# Altium integrated library Altium_WCAP-ATG8 (rev22a).IntLib: 195 symbols (part 2 of 2) (continued)
## 860010772003
designator C?, comment 0.33uF  (value not drawn)
WCAP-ATG8 Aluminum Electrolytic Capacitor, Radial THT, D5xH11mm, 0.33uF, 63V; Manufacturer: Wurth Elektronik; Manufacturer Part Number: 860010772003; Capacitance Tolerance: +/-20%; Dissipation Factor: 9%; Endurance: 2000h; Leakage Current: 3uA; Ripple Current: 6mA; Technical Reference: ATBC110R33M063DSPA3B000; ComponentLink1Description: Manufacturer Link; ComponentLink1URL: https://www.we-online.com/redexpert/article/860010772003?ad; ComponentLink2Description: Datasheet; ComponentLink2URL: https://www.we-online.com/redexpert/spec/860010772003?ad; Category: Aluminum Electrolytic Capacitors; Match Code: WCAP-ATG8; Mount: Through Hole; Operating Temperature Max: 85°C; Operating Temperature Min: -40°C; Packaging: Ammo Pack; Height: 11mm; Diameter: 5mm; Capacitance: 0.33uF; Rated Voltage (DC): 63V
footprint WCAP-ATG8_D5H11
pins: 1 P, 2 N

## 860010772004
designator C?, comment 0.47uF  (value not drawn)
WCAP-ATG8 Aluminum Electrolytic Capacitor, Radial THT, D5xH11mm, 0.47uF, 63V; Manufacturer: Wurth Elektronik; Manufacturer Part Number: 860010772004; Capacitance Tolerance: +/-20%; Dissipation Factor: 9%; Endurance: 2000h; Leakage Current: 3uA; Ripple Current: 8mA; Technical Reference: ATBC110R47M063DSPA3B000; ComponentLink1Description: Manufacturer Link; ComponentLink1URL: https://www.we-online.com/redexpert/article/860010772004?ad; ComponentLink2Description: Datasheet; ComponentLink2URL: https://www.we-online.com/redexpert/spec/860010772004?ad; Category: Aluminum Electrolytic Capacitors; Match Code: WCAP-ATG8; Mount: Through Hole; Operating Temperature Max: 85°C; Operating Temperature Min: -40°C; Packaging: Ammo Pack; Height: 11mm; Diameter: 5mm; Capacitance: 0.47uF; Rated Voltage (DC): 63V
footprint WCAP-ATG8_D5H11
pins: 1 P, 2 N

## 860010772005
designator C?, comment 1uF  (value not drawn)
WCAP-ATG8 Aluminum Electrolytic Capacitor, Radial THT, D5xH11mm, 1uF, 63V; Manufacturer: Wurth Elektronik; Manufacturer Part Number: 860010772005; Capacitance Tolerance: +/-20%; Dissipation Factor: 9%; Endurance: 2000h; Leakage Current: 3uA; Ripple Current: 17mA; Technical Reference: ATBC110010M063DSPA3B000; ComponentLink1Description: Manufacturer Link; ComponentLink1URL: https://www.we-online.com/redexpert/article/860010772005?ad; ComponentLink2Description: Datasheet; ComponentLink2URL: https://www.we-online.com/redexpert/spec/860010772005?ad; Category: Aluminum Electrolytic Capacitors; Match Code: WCAP-ATG8; Mount: Through Hole; Operating Temperature Max: 85°C; Operating Temperature Min: -40°C; Packaging: Ammo Pack; Height: 11mm; Diameter: 5mm; Capacitance: 1uF; Rated Voltage (DC): 63V
footprint WCAP-ATG8_D5H11
pins: 1 P, 2 N

## 860010772006
designator C?, comment 2.2uF  (value not drawn)
WCAP-ATG8 Aluminum Electrolytic Capacitor, Radial THT, D5xH11mm, 2.2uF, 63V; Manufacturer: Wurth Elektronik; Manufacturer Part Number: 860010772006; Capacitance Tolerance: +/-20%; Dissipation Factor: 9%; Endurance: 2000h; Leakage Current: 3uA; Ripple Current: 31mA; Technical Reference: ATBC1102R2M063DSPA3B000; ComponentLink1Description: Manufacturer Link; ComponentLink1URL: https://www.we-online.com/redexpert/article/860010772006?ad; ComponentLink2Description: Datasheet; ComponentLink2URL: https://www.we-online.com/redexpert/spec/860010772006?ad; Category: Aluminum Electrolytic Capacitors; Match Code: WCAP-ATG8; Mount: Through Hole; Operating Temperature Max: 85°C; Operating Temperature Min: -40°C; Packaging: Ammo Pack; Height: 11mm; Diameter: 5mm; Capacitance: 2.2uF; Rated Voltage (DC): 63V
footprint WCAP-ATG8_D5H11
pins: 1 P, 2 N

## 860010772007
designator C?, comment 3.3uF  (value not drawn)
WCAP-ATG8 Aluminum Electrolytic Capacitor, Radial THT, D5xH11mm, 3.3uF, 63V; Manufacturer: Wurth Elektronik; Manufacturer Part Number: 860010772007; Capacitance Tolerance: +/-20%; Dissipation Factor: 9%; Endurance: 2000h; Leakage Current: 3uA; Ripple Current: 39mA; Technical Reference: ATBC1103R3M063DSPA3B000; ComponentLink1Description: Manufacturer Link; ComponentLink1URL: https://www.we-online.com/redexpert/article/860010772007?ad; ComponentLink2Description: Datasheet; ComponentLink2URL: https://www.we-online.com/redexpert/spec/860010772007?ad; Category: Aluminum Electrolytic Capacitors; Match Code: WCAP-ATG8; Mount: Through Hole; Operating Temperature Max: 85°C; Operating Temperature Min: -40°C; Packaging: Ammo Pack; Height: 11mm; Diameter: 5mm; Capacitance: 3.3uF; Rated Voltage (DC): 63V
footprint WCAP-ATG8_D5H11
pins: 1 P, 2 N

## 860010772008
designator C?, comment 4.7uF  (value not drawn)
WCAP-ATG8 Aluminum Electrolytic Capacitor, Radial THT, D5xH11mm, 4.7uF, 63V; Manufacturer: Wurth Elektronik; Manufacturer Part Number: 860010772008; Capacitance Tolerance: +/-20%; Dissipation Factor: 9%; Endurance: 2000h; Leakage Current: 3uA; Ripple Current: 50mA; Technical Reference: ATBC1104R7M063DSPA3B000; ComponentLink1Description: Manufacturer Link; ComponentLink1URL: https://www.we-online.com/redexpert/article/860010772008?ad; ComponentLink2Description: Datasheet; ComponentLink2URL: https://www.we-online.com/redexpert/spec/860010772008?ad; Category: Aluminum Electrolytic Capacitors; Match Code: WCAP-ATG8; Mount: Through Hole; Operating Temperature Max: 85°C; Operating Temperature Min: -40°C; Packaging: Ammo Pack; Height: 11mm; Diameter: 5mm; Capacitance: 4.7uF; Rated Voltage (DC): 63V
footprint WCAP-ATG8_D5H11
pins: 1 P, 2 N

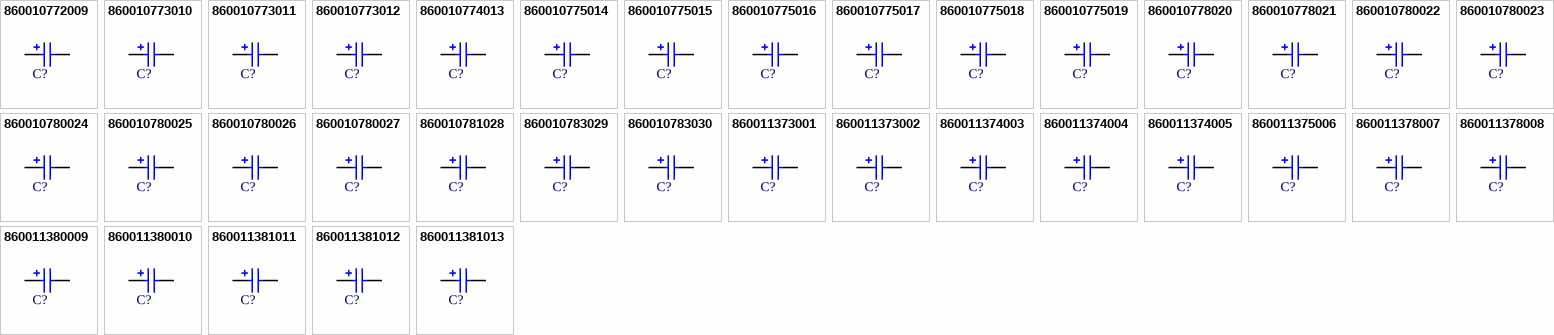
[diagram p4: symbols 860010772009 to 860011381013]

## 860010772009
designator C?, comment 10uF  (value not drawn)
WCAP-ATG8 Aluminum Electrolytic Capacitor, Radial THT, D5xH11mm, 10uF, 63V; Manufacturer: Wurth Elektronik; Manufacturer Part Number: 860010772009; Capacitance Tolerance: +/-20%; Dissipation Factor: 9%; Endurance: 2000h; Leakage Current: 6.3uA; Ripple Current: 77mA; Technical Reference: ATBC110100M063DSPA3B000; ComponentLink1Description: Manufacturer Link; ComponentLink1URL: https://www.we-online.com/redexpert/article/860010772009?ad; ComponentLink2Description: Datasheet; ComponentLink2URL: https://www.we-online.com/redexpert/spec/860010772009?ad; Category: Aluminum Electrolytic Capacitors; Match Code: WCAP-ATG8; Mount: Through Hole; Operating Temperature Max: 85°C; Operating Temperature Min: -40°C; Packaging: Ammo Pack; Height: 11mm; Diameter: 5mm; Capacitance: 10uF; Rated Voltage (DC): 63V
footprint WCAP-ATG8_D5H11
pins: 1 P, 2 N

## 860010773010
designator C?, comment 22uF  (value not drawn)
WCAP-ATG8 Aluminum Electrolytic Capacitor, Radial THT, D6.3xH11mm, 22uF, 63V; Manufacturer: Wurth Elektronik; Manufacturer Part Number: 860010773010; Capacitance Tolerance: +/-20%; Dissipation Factor: 9%; Endurance: 2000h; Leakage Current: 13.86uA; Ripple Current: 127mA; Technical Reference: ATBD110220M063DSPA4B000; ComponentLink1Description: Manufacturer Link; ComponentLink1URL: https://www.we-online.com/redexpert/article/860010773010?ad; ComponentLink2Description: Datasheet; ComponentLink2URL: https://www.we-online.com/redexpert/spec/860010773010?ad; Category: Aluminum Electrolytic Capacitors; Match Code: WCAP-ATG8; Mount: Through Hole; Operating Temperature Max: 85°C; Operating Temperature Min: -40°C; Packaging: Ammo Pack; Height: 11mm; Diameter: 6.3mm; Capacitance: 22uF; Rated Voltage (DC): 63V
footprint WCAP-ATG8_D6.3H11
pins: 1 P, 2 N

## 860010773011
designator C?, comment 33uF  (value not drawn)
WCAP-ATG8 Aluminum Electrolytic Capacitor, Radial THT, D6.3xH11mm, 33uF, 63V; Manufacturer: Wurth Elektronik; Manufacturer Part Number: 860010773011; Capacitance Tolerance: +/-20%; Dissipation Factor: 9%; Endurance: 2000h; Leakage Current: 20.79uA; Ripple Current: 149mA; Technical Reference: ATBD110330M063DSPA4B000; ComponentLink1Description: Manufacturer Link; ComponentLink1URL: https://www.we-online.com/redexpert/article/860010773011?ad; ComponentLink2Description: Datasheet; ComponentLink2URL: https://www.we-online.com/redexpert/spec/860010773011?ad; Category: Aluminum Electrolytic Capacitors; Match Code: WCAP-ATG8; Mount: Through Hole; Operating Temperature Max: 85°C; Operating Temperature Min: -40°C; Packaging: Ammo Pack; Height: 11mm; Diameter: 6.3mm; Capacitance: 33uF; Rated Voltage (DC): 63V
footprint WCAP-ATG8_D6.3H11
pins: 1 P, 2 N

## 860010773012
designator C?, comment 47uF  (value not drawn)
WCAP-ATG8 Aluminum Electrolytic Capacitor, Radial THT, D6.3xH11mm, 47uF, 63V; Manufacturer: Wurth Elektronik; Manufacturer Part Number: 860010773012; Capacitance Tolerance: +/-20%; Dissipation Factor: 9%; Endurance: 2000h; Leakage Current: 29.61uA; Ripple Current: 198mA; Technical Reference: ATBD110470M063DSPA4B000; ComponentLink1Description: Manufacturer Link; ComponentLink1URL: https://www.we-online.com/redexpert/article/860010773012?ad; ComponentLink2Description: Datasheet; ComponentLink2URL: https://www.we-online.com/redexpert/spec/860010773012?ad; Category: Aluminum Electrolytic Capacitors; Match Code: WCAP-ATG8; Mount: Through Hole; Operating Temperature Max: 85°C; Operating Temperature Min: -40°C; Packaging: Ammo Pack; Height: 11mm; Diameter: 6.3mm; Capacitance: 47uF; Rated Voltage (DC): 63V
footprint WCAP-ATG8_D6.3H11
pins: 1 P, 2 N

## 860010774013
designator C?, comment 68uF  (value not drawn)
WCAP-ATG8 Aluminum Electrolytic Capacitor, Radial THT, D8xH11.5mm, 68uF, 63V; Manufacturer: Wurth Elektronik; Manufacturer Part Number: 860010774013; Capacitance Tolerance: +/-20%; Dissipation Factor: 9%; Endurance: 2000h; Leakage Current: 42.84uA; Ripple Current: 253mA; Technical Reference: ATBE115680M063DSPA7B000; ComponentLink1Description: Manufacturer Link; ComponentLink1URL: https://www.we-online.com/redexpert/article/860010774013?ad; ComponentLink2Description: Datasheet; ComponentLink2URL: https://www.we-online.com/redexpert/spec/860010774013?ad; Category: Aluminum Electrolytic Capacitors; Match Code: WCAP-ATG8; Mount: Through Hole; Operating Temperature Max: 85°C; Operating Temperature Min: -40°C; Packaging: Ammo Pack; Height: 11.5mm; Diameter: 8mm; Capacitance: 68uF; Rated Voltage (DC): 63V
footprint WCAP-ATG8_D8H11.5
pins: 1 P, 2 N

## 860010775014
designator C?, comment 100uF  (value not drawn)
WCAP-ATG8 Aluminum Electrolytic Capacitor, Radial THT, D10xH12.5mm, 100uF, 63V; Manufacturer: Wurth Elektronik; Manufacturer Part Number: 860010775014; Capacitance Tolerance: +/-20%; Dissipation Factor: 9%; Endurance: 2000h; Leakage Current: 63uA; Ripple Current: 330mA; Technical Reference: ATBF125101M063DSPA9B000; ComponentLink1Description: Manufacturer Link; ComponentLink1URL: https://www.we-online.com/redexpert/article/860010775014?ad; ComponentLink2Description: Datasheet; ComponentLink2URL: https://www.we-online.com/redexpert/spec/860010775014?ad; Category: Aluminum Electrolytic Capacitors; Match Code: WCAP-ATG8; Mount: Through Hole; Operating Temperature Max: 85°C; Operating Temperature Min: -40°C; Packaging: Ammo Pack; Height: 12.5mm; Diameter: 10mm; Capacitance: 100uF; Rated Voltage (DC): 63V
footprint WCAP-ATG8_D10H12.5
pins: 1 P, 2 N

## 860010775015
designator C?, comment 120uF  (value not drawn)
WCAP-ATG8 Aluminum Electrolytic Capacitor, Radial THT, D10xH16mm, 120uF, 63V; Manufacturer: Wurth Elektronik; Manufacturer Part Number: 860010775015; Capacitance Tolerance: +/-20%; Dissipation Factor: 9%; Endurance: 2000h; Leakage Current: 75.6uA; Ripple Current: 396mA; Technical Reference: ATBF160121M063DSPAAB000; ComponentLink1Description: Manufacturer Link; ComponentLink1URL: https://www.we-online.com/redexpert/article/860010775015?ad; ComponentLink2Description: Datasheet; ComponentLink2URL: https://www.we-online.com/redexpert/spec/860010775015?ad; Category: Aluminum Electrolytic Capacitors; Match Code: WCAP-ATG8; Mount: Through Hole; Operating Temperature Max: 85°C; Operating Temperature Min: -40°C; Packaging: Ammo Pack; Height: 16mm; Diameter: 10mm; Capacitance: 120uF; Rated Voltage (DC): 63V
footprint WCAP-ATG8_D10H16
pins: 1 P, 2 N

## 860010775016
designator C?, comment 150uF  (value not drawn)
WCAP-ATG8 Aluminum Electrolytic Capacitor, Radial THT, D10xH16mm, 150uF, 63V; Manufacturer: Wurth Elektronik; Manufacturer Part Number: 860010775016; Capacitance Tolerance: +/-20%; Dissipation Factor: 9%; Endurance: 2000h; Leakage Current: 94.5uA; Ripple Current: 462mA; Technical Reference: ATBF160151M063DSPAAB000; ComponentLink1Description: Manufacturer Link; ComponentLink1URL: https://www.we-online.com/redexpert/article/860010775016?ad; ComponentLink2Description: Datasheet; ComponentLink2URL: https://www.we-online.com/redexpert/spec/860010775016?ad; Category: Aluminum Electrolytic Capacitors; Match Code: WCAP-ATG8; Mount: Through Hole; Operating Temperature Max: 85°C; Operating Temperature Min: -40°C; Packaging: Ammo Pack; Height: 16mm; Diameter: 10mm; Capacitance: 150uF; Rated Voltage (DC): 63V
footprint WCAP-ATG8_D10H16
pins: 1 P, 2 N

## 860010775017
designator C?, comment 180uF  (value not drawn)
WCAP-ATG8 Aluminum Electrolytic Capacitor, Radial THT, D10xH16mm, 180uF, 63V; Manufacturer: Wurth Elektronik; Manufacturer Part Number: 860010775017; Capacitance Tolerance: +/-20%; Dissipation Factor: 9%; Endurance: 2000h; Leakage Current: 113.4uA; Ripple Current: 528mA; Technical Reference: ATBF160181M063DSPAAB000; ComponentLink1Description: Manufacturer Link; ComponentLink1URL: https://www.we-online.com/redexpert/article/860010775017?ad; ComponentLink2Description: Datasheet; ComponentLink2URL: https://www.we-online.com/redexpert/spec/860010775017?ad; Category: Aluminum Electrolytic Capacitors; Match Code: WCAP-ATG8; Mount: Through Hole; Operating Temperature Max: 85°C; Operating Temperature Min: -40°C; Packaging: Ammo Pack; Height: 16mm; Diameter: 10mm; Capacitance: 180uF; Rated Voltage (DC): 63V
footprint WCAP-ATG8_D10H16
pins: 1 P, 2 N

## 860010775018
designator C?, comment 220uF  (value not drawn)
WCAP-ATG8 Aluminum Electrolytic Capacitor, Radial THT, D10xH16mm, 220uF, 63V; Manufacturer: Wurth Elektronik; Manufacturer Part Number: 860010775018; Capacitance Tolerance: +/-20%; Dissipation Factor: 9%; Endurance: 2000h; Leakage Current: 138.6uA; Ripple Current: 550mA; Technical Reference: ATBF160221M063DSPAAB000; ComponentLink1Description: Manufacturer Link; ComponentLink1URL: https://www.we-online.com/redexpert/article/860010775018?ad; ComponentLink2Description: Datasheet; ComponentLink2URL: https://www.we-online.com/redexpert/spec/860010775018?ad; Category: Aluminum Electrolytic Capacitors; Match Code: WCAP-ATG8; Mount: Through Hole; Operating Temperature Max: 85°C; Operating Temperature Min: -40°C; Packaging: Ammo Pack; Height: 16mm; Diameter: 10mm; Capacitance: 220uF; Rated Voltage (DC): 63V
footprint WCAP-ATG8_D10H16
pins: 1 P, 2 N

## 860010775019
designator C?, comment 330uF  (value not drawn)
WCAP-ATG8 Aluminum Electrolytic Capacitor, Radial THT, D10xH20mm, 330uF, 63V; Manufacturer: Wurth Elektronik; Manufacturer Part Number: 860010775019; Capacitance Tolerance: +/-20%; Dissipation Factor: 9%; Endurance: 2000h; Leakage Current: 207.9uA; Ripple Current: 759mA; Technical Reference: ATBF200331M063DSPAAB000; ComponentLink1Description: Manufacturer Link; ComponentLink1URL: https://www.we-online.com/redexpert/article/860010775019?ad; ComponentLink2Description: Datasheet; ComponentLink2URL: https://www.we-online.com/redexpert/spec/860010775019?ad; Category: Aluminum Electrolytic Capacitors; Match Code: WCAP-ATG8; Mount: Through Hole; Operating Temperature Max: 85°C; Operating Temperature Min: -40°C; Packaging: Ammo Pack; Height: 20mm; Diameter: 10mm; Capacitance: 330uF; Rated Voltage (DC): 63V
footprint WCAP-ATG8_D10H20
pins: 1 P, 2 N

## 860010778020
designator C?, comment 470uF  (value not drawn)
WCAP-ATG8 Aluminum Electrolytic Capacitor, Radial THT, D13xH20mm, 470uF, 63V; Manufacturer: Wurth Elektronik; Manufacturer Part Number: 860010778020; Capacitance Tolerance: +/-20%; Dissipation Factor: 9%; Endurance: 2000h; Leakage Current: 296.1uA; Ripple Current: 968mA; Technical Reference: ATBI200471M063DSPACB000; ComponentLink1Description: Manufacturer Link; ComponentLink1URL: https://www.we-online.com/redexpert/article/860010778020?ad; ComponentLink2Description: Datasheet; ComponentLink2URL: https://www.we-online.com/redexpert/spec/860010778020?ad; Category: Aluminum Electrolytic Capacitors; Match Code: WCAP-ATG8; Mount: Through Hole; Operating Temperature Max: 85°C; Operating Temperature Min: -40°C; Packaging: Ammo Pack; Height: 20mm; Diameter: 13mm; Capacitance: 470uF; Rated Voltage (DC): 63V
footprint WCAP-ATG8_D13H20
pins: 1 P, 2 N

## 860010778021
designator C?, comment 560uF  (value not drawn)
WCAP-ATG8 Aluminum Electrolytic Capacitor, Radial THT, D13xH25mm, 560uF, 63V; Manufacturer: Wurth Elektronik; Manufacturer Part Number: 860010778021; Capacitance Tolerance: +/-20%; Dissipation Factor: 9%; Endurance: 2000h; Leakage Current: 352.8uA; Ripple Current: 1056mA; Technical Reference: ATBI250561M063DSPACB000; ComponentLink1Description: Manufacturer Link; ComponentLink1URL: https://www.we-online.com/redexpert/article/860010778021?ad; ComponentLink2Description: Datasheet; ComponentLink2URL: https://www.we-online.com/redexpert/spec/860010778021?ad; Category: Aluminum Electrolytic Capacitors; Match Code: WCAP-ATG8; Mount: Through Hole; Operating Temperature Max: 85°C; Operating Temperature Min: -40°C; Packaging: Ammo Pack; Height: 25mm; Diameter: 13mm; Capacitance: 560uF; Rated Voltage (DC): 63V
footprint WCAP-ATG8_D13H25
pins: 1 P, 2 N

## 860010780022
designator C?, comment 680uF  (value not drawn)
WCAP-ATG8 Aluminum Electrolytic Capacitor, Radial THT, D16xH25mm, 680uF, 63V; Manufacturer: Wurth Elektronik; Manufacturer Part Number: 860010780022; Capacitance Tolerance: +/-20%; Dissipation Factor: 9%; Endurance: 2000h; Leakage Current: 428.4uA; Ripple Current: 1265mA; Technical Reference: ATBK250681M063DSPAEB000; ComponentLink1Description: Manufacturer Link; ComponentLink1URL: https://www.we-online.com/redexpert/article/860010780022?ad; ComponentLink2Description: Datasheet; ComponentLink2URL: https://www.we-online.com/redexpert/spec/860010780022?ad; Category: Aluminum Electrolytic Capacitors; Match Code: WCAP-ATG8; Mount: Through Hole; Operating Temperature Max: 85°C; Operating Temperature Min: -40°C; Packaging: Ammo Pack; Height: 25mm; Diameter: 16mm; Capacitance: 680uF; Rated Voltage (DC): 63V
footprint WCAP-ATG8_D16H25
pins: 1 P, 2 N

## 860010780023
designator C?, comment 820uF  (value not drawn)
WCAP-ATG8 Aluminum Electrolytic Capacitor, Radial THT, D16xH25mm, 820uF, 63V; Manufacturer: Wurth Elektronik; Manufacturer Part Number: 860010780023; Capacitance Tolerance: +/-20%; Dissipation Factor: 9%; Endurance: 2000h; Leakage Current: 516.6uA; Ripple Current: 1430mA; Technical Reference: ATBK250821M063DSPAEB000; ComponentLink1Description: Manufacturer Link; ComponentLink1URL: https://www.we-online.com/redexpert/article/860010780023?ad; ComponentLink2Description: Datasheet; ComponentLink2URL: https://www.we-online.com/redexpert/spec/860010780023?ad; Category: Aluminum Electrolytic Capacitors; Match Code: WCAP-ATG8; Mount: Through Hole; Operating Temperature Max: 85°C; Operating Temperature Min: -40°C; Packaging: Ammo Pack; Height: 25mm; Diameter: 16mm; Capacitance: 820uF; Rated Voltage (DC): 63V
footprint WCAP-ATG8_D16H25
pins: 1 P, 2 N

## 860010780024
designator C?, comment 1000uF  (value not drawn)
WCAP-ATG8 Aluminum Electrolytic Capacitor, Radial THT, D16xH25mm, 1000uF, 63V; Manufacturer: Wurth Elektronik; Manufacturer Part Number: 860010780024; Capacitance Tolerance: +/-20%; Dissipation Factor: 9%; Endurance: 2000h; Leakage Current: 630uA; Ripple Current: 1540mA; Technical Reference: ATBK250102M063DSPAEB000; ComponentLink1Description: Manufacturer Link; ComponentLink1URL: https://www.we-online.com/redexpert/article/860010780024?ad; ComponentLink2Description: Datasheet; ComponentLink2URL: https://www.we-online.com/redexpert/spec/860010780024?ad; Category: Aluminum Electrolytic Capacitors; Match Code: WCAP-ATG8; Mount: Through Hole; Operating Temperature Max: 85°C; Operating Temperature Min: -40°C; Packaging: Ammo Pack; Height: 25mm; Diameter: 16mm; Capacitance: 1000uF; Rated Voltage (DC): 63V
footprint WCAP-ATG8_D16H25
pins: 1 P, 2 N

## 860010780025
designator C?, comment 1200uF  (value not drawn)
WCAP-ATG8 Aluminum Electrolytic Capacitor, Radial THT, D16xH31.5mm, 1200uF, 63V; Manufacturer: Wurth Elektronik; Manufacturer Part Number: 860010780025; Capacitance Tolerance: +/-20%; Dissipation Factor: 9%; Endurance: 2000h; Leakage Current: 756uA; Ripple Current: 1837mA; Technical Reference: ATBK315122M063DSPADB000; ComponentLink1Description: Manufacturer Link; ComponentLink1URL: https://www.we-online.com/redexpert/article/860010780025?ad; ComponentLink2Description: Datasheet; ComponentLink2URL: https://www.we-online.com/redexpert/spec/860010780025?ad; Category: Aluminum Electrolytic Capacitors; Match Code: WCAP-ATG8; Mount: Through Hole; Operating Temperature Max: 85°C; Operating Temperature Min: -40°C; Packaging: Ammo Pack; Height: 31.5mm; Diameter: 16mm; Capacitance: 1200uF; Rated Voltage (DC): 63V
footprint WCAP-ATG8_D16H31.5
pins: 1 P, 2 N

## 860010780026
designator C?, comment 1500uF  (value not drawn)
WCAP-ATG8 Aluminum Electrolytic Capacitor, Radial THT, D16xH35.5mm, 1500uF, 63V; Manufacturer: Wurth Elektronik; Manufacturer Part Number: 860010780026; Capacitance Tolerance: +/-20%; Dissipation Factor: 9%; Endurance: 2000h; Leakage Current: 945uA; Ripple Current: 2090mA; Technical Reference: ATBK355152M063DSPADB000; ComponentLink1Description: Manufacturer Link; ComponentLink1URL: https://www.we-online.com/redexpert/article/860010780026?ad; ComponentLink2Description: Datasheet; ComponentLink2URL: https://www.we-online.com/redexpert/spec/860010780026?ad; Category: Aluminum Electrolytic Capacitors; Match Code: WCAP-ATG8; Mount: Through Hole; Operating Temperature Max: 85°C; Operating Temperature Min: -40°C; Packaging: Ammo Pack; Height: 35.5mm; Diameter: 16mm; Capacitance: 1500uF; Rated Voltage (DC): 63V
footprint WCAP-ATG8_D16H35.5
pins: 1 P, 2 N

## 860010780027
designator C?, comment 1800uF  (value not drawn)
WCAP-ATG8 Aluminum Electrolytic Capacitor, Radial THT, D16xH35.5mm, 1800uF, 63V; Manufacturer: Wurth Elektronik; Manufacturer Part Number: 860010780027; Capacitance Tolerance: +/-20%; Dissipation Factor: 9%; Endurance: 2000h; Leakage Current: 1134uA; Ripple Current: 2255mA; Technical Reference: ATBK355182M063DSPADB000; ComponentLink1Description: Manufacturer Link; ComponentLink1URL: https://www.we-online.com/redexpert/article/860010780027?ad; ComponentLink2Description: Datasheet; ComponentLink2URL: https://www.we-online.com/redexpert/spec/860010780027?ad; Category: Aluminum Electrolytic Capacitors; Match Code: WCAP-ATG8; Mount: Through Hole; Operating Temperature Max: 85°C; Operating Temperature Min: -40°C; Packaging: Ammo Pack; Height: 35.5mm; Diameter: 16mm; Capacitance: 1800uF; Rated Voltage (DC): 63V
footprint WCAP-ATG8_D16H35.5
pins: 1 P, 2 N

## 860010781028
designator C?, comment 2200uF  (value not drawn)
WCAP-ATG8 Aluminum Electrolytic Capacitor, Radial THT, D18xH35.5mm, 2200uF, 63V; Manufacturer: Wurth Elektronik; Manufacturer Part Number: 860010781028; Capacitance Tolerance: +/-20%; Dissipation Factor: 9%; Endurance: 2000h; Leakage Current: 1386uA; Ripple Current: 2475mA; Technical Reference: ATBL355222M063DSPAEB000; ComponentLink1Description: Manufacturer Link; ComponentLink1URL: https://www.we-online.com/redexpert/article/860010781028?ad; ComponentLink2Description: Datasheet; ComponentLink2URL: https://www.we-online.com/redexpert/spec/860010781028?ad; Category: Aluminum Electrolytic Capacitors; Match Code: WCAP-ATG8; Mount: Through Hole; Operating Temperature Max: 85°C; Operating Temperature Min: -40°C; Packaging: Ammo Pack; Height: 35.5mm; Diameter: 18mm; Capacitance: 2200uF; Rated Voltage (DC): 63V
footprint WCAP-ATG8_D18H35.5
pins: 1 P, 2 N

## 860010783029
designator C?, comment 2700uF  (value not drawn)
WCAP-ATG8 Aluminum Electrolytic Capacitor, Radial THT, D22xH41mm, 2700uF, 63V; Manufacturer: Wurth Elektronik; Manufacturer Part Number: 860010783029; Capacitance Tolerance: +/-20%; Dissipation Factor: 9%; Endurance: 2000h; Leakage Current: 1701uA; Ripple Current: 2860mA; Technical Reference: ATBN410272M063DSPS2B000; ComponentLink1Description: Manufacturer Link; ComponentLink1URL: https://www.we-online.com/redexpert/article/860010783029?ad; ComponentLink2Description: Datasheet; ComponentLink2URL: https://www.we-online.com/redexpert/spec/860010783029?ad; Category: Aluminum Electrolytic Capacitors; Match Code: WCAP-ATG8; Mount: Through Hole; Operating Temperature Max: 85°C; Operating Temperature Min: -40°C; Packaging: Ammo Pack; Height: 41mm; Diameter: 22mm; Capacitance: 2700uF; Rated Voltage (DC): 63V
footprint WCAP-ATG8_D22H41
pins: 1 P, 2 N

## 860010783030
designator C?, comment 3300uF  (value not drawn)
WCAP-ATG8 Aluminum Electrolytic Capacitor, Radial THT, D22xH41mm, 3300uF, 63V; Manufacturer: Wurth Elektronik; Manufacturer Part Number: 860010783030; Capacitance Tolerance: +/-20%; Dissipation Factor: 9%; Endurance: 2000h; Leakage Current: 2079uA; Ripple Current: 3080mA; Technical Reference: ATBN410332M063DSPS2B000; ComponentLink1Description: Manufacturer Link; ComponentLink1URL: https://www.we-online.com/redexpert/article/860010783030?ad; ComponentLink2Description: Datasheet; ComponentLink2URL: https://www.we-online.com/redexpert/spec/860010783030?ad; Category: Aluminum Electrolytic Capacitors; Match Code: WCAP-ATG8; Mount: Through Hole; Operating Temperature Max: 85°C; Operating Temperature Min: -40°C; Packaging: Ammo Pack; Height: 41mm; Diameter: 22mm; Capacitance: 3300uF; Rated Voltage (DC): 63V
footprint WCAP-ATG8_D22H41
pins: 1 P, 2 N

## 860011373001
designator C?, comment 0.47uF  (value not drawn)
WCAP-ATG8 Aluminum Electrolytic Capacitor, Radial THT, D6.3xH11mm, 0.47uF, 400V; Manufacturer: Wurth Elektronik; Manufacturer Part Number: 860011373001; Capacitance Tolerance: +/-20%; Dissipation Factor: 15%; Endurance: 2000h; Leakage Current: 5.64uA; Ripple Current: 12mA; Technical Reference: ATAD110R47M400DSPA4B000; ComponentLink1Description: Manufacturer Link; ComponentLink1URL: https://www.we-online.com/redexpert/article/860011373001?ad; ComponentLink2Description: Datasheet; ComponentLink2URL: https://www.we-online.com/redexpert/spec/860011373001?ad; Category: Aluminum Electrolytic Capacitors; Match Code: WCAP-ATG8; Mount: Through Hole; Operating Temperature Max: 85°C; Operating Temperature Min: -25°C; Packaging: Ammo Pack; Height: 11mm; Diameter: 6.3mm; Capacitance: 0.47uF; Rated Voltage (DC): 400V
footprint WCAP-ATG8_D6.3H11
pins: 1 P, 2 N

## 860011373002
designator C?, comment 1uF  (value not drawn)
WCAP-ATG8 Aluminum Electrolytic Capacitor, Radial THT, D6.3xH11mm, 1uF, 400V; Manufacturer: Wurth Elektronik; Manufacturer Part Number: 860011373002; Capacitance Tolerance: +/-20%; Dissipation Factor: 15%; Endurance: 2000h; Leakage Current: 12uA; Ripple Current: 20mA; Technical Reference: ATAD110010M400DSPA4B000; ComponentLink1Description: Manufacturer Link; ComponentLink1URL: https://www.we-online.com/redexpert/article/860011373002?ad; ComponentLink2Description: Datasheet; ComponentLink2URL: https://www.we-online.com/redexpert/spec/860011373002?ad; Category: Aluminum Electrolytic Capacitors; Match Code: WCAP-ATG8; Mount: Through Hole; Operating Temperature Max: 85°C; Operating Temperature Min: -25°C; Packaging: Ammo Pack; Height: 11mm; Diameter: 6.3mm; Capacitance: 1uF; Rated Voltage (DC): 400V
footprint WCAP-ATG8_D6.3H11
pins: 1 P, 2 N

## 860011374003
designator C?, comment 2.2uF  (value not drawn)
WCAP-ATG8 Aluminum Electrolytic Capacitor, Radial THT, D8xH11.5mm, 2.2uF, 400V; Manufacturer: Wurth Elektronik; Manufacturer Part Number: 860011374003; Capacitance Tolerance: +/-20%; Dissipation Factor: 15%; Endurance: 2000h; Leakage Current: 26.4uA; Ripple Current: 32mA; Technical Reference: ATAE1152R2M400DSPA7B000; ComponentLink1Description: Manufacturer Link; ComponentLink1URL: https://www.we-online.com/redexpert/article/860011374003?ad; ComponentLink2Description: Datasheet; ComponentLink2URL: https://www.we-online.com/redexpert/spec/860011374003?ad; Category: Aluminum Electrolytic Capacitors; Match Code: WCAP-ATG8; Mount: Through Hole; Operating Temperature Max: 85°C; Operating Temperature Min: -25°C; Packaging: Ammo Pack; Height: 11.5mm; Diameter: 8mm; Capacitance: 2.2uF; Rated Voltage (DC): 400V
footprint WCAP-ATG8_D8H11.5
pins: 1 P, 2 N

## 860011374004
designator C?, comment 3.3uF  (value not drawn)
WCAP-ATG8 Aluminum Electrolytic Capacitor, Radial THT, D8xH11.5mm, 3.3uF, 400V; Manufacturer: Wurth Elektronik; Manufacturer Part Number: 860011374004; Capacitance Tolerance: +/-20%; Dissipation Factor: 15%; Endurance: 2000h; Leakage Current: 39.6uA; Ripple Current: 45mA; Technical Reference: ATAE1153R3M400DSPA7B000; ComponentLink1Description: Manufacturer Link; ComponentLink1URL: https://www.we-online.com/redexpert/article/860011374004?ad; ComponentLink2Description: Datasheet; ComponentLink2URL: https://www.we-online.com/redexpert/spec/860011374004?ad; Category: Aluminum Electrolytic Capacitors; Match Code: WCAP-ATG8; Mount: Through Hole; Operating Temperature Max: 85°C; Operating Temperature Min: -25°C; Packaging: Ammo Pack; Height: 11.5mm; Diameter: 8mm; Capacitance: 3.3uF; Rated Voltage (DC): 400V
footprint WCAP-ATG8_D8H11.5
pins: 1 P, 2 N

## 860011374005
designator C?, comment 4.7uF  (value not drawn)
WCAP-ATG8 Aluminum Electrolytic Capacitor, Radial THT, D8xH11.5mm, 4.7uF, 400V; Manufacturer: Wurth Elektronik; Manufacturer Part Number: 860011374005; Capacitance Tolerance: +/-20%; Dissipation Factor: 15%; Endurance: 2000h; Leakage Current: 56.4uA; Ripple Current: 55mA; Technical Reference: ATAE1154R7M400DSPA7B000; ComponentLink1Description: Manufacturer Link; ComponentLink1URL: https://www.we-online.com/redexpert/article/860011374005?ad; ComponentLink2Description: Datasheet; ComponentLink2URL: https://www.we-online.com/redexpert/spec/860011374005?ad; Category: Aluminum Electrolytic Capacitors; Match Code: WCAP-ATG8; Mount: Through Hole; Operating Temperature Max: 85°C; Operating Temperature Min: -25°C; Packaging: Ammo Pack; Height: 11.5mm; Diameter: 8mm; Capacitance: 4.7uF; Rated Voltage (DC): 400V
footprint WCAP-ATG8_D8H11.5
pins: 1 P, 2 N

## 860011375006
designator C?, comment 10uF  (value not drawn)
WCAP-ATG8 Aluminum Electrolytic Capacitor, Radial THT, D10xH16mm, 10uF, 400V; Manufacturer: Wurth Elektronik; Manufacturer Part Number: 860011375006; Capacitance Tolerance: +/-20%; Dissipation Factor: 15%; Endurance: 2000h; Leakage Current: 120uA; Ripple Current: 100mA; Technical Reference: ATAF160100M400DSPAAB000; ComponentLink1Description: Manufacturer Link; ComponentLink1URL: https://www.we-online.com/redexpert/article/860011375006?ad; ComponentLink2Description: Datasheet; ComponentLink2URL: https://www.we-online.com/redexpert/spec/860011375006?ad; Category: Aluminum Electrolytic Capacitors; Match Code: WCAP-ATG8; Mount: Through Hole; Operating Temperature Max: 85°C; Operating Temperature Min: -25°C; Packaging: Ammo Pack; Height: 16mm; Diameter: 10mm; Capacitance: 10uF; Rated Voltage (DC): 400V
footprint WCAP-ATG8_D10H16
pins: 1 P, 2 N

## 860011378007
designator C?, comment 22uF  (value not drawn)
WCAP-ATG8 Aluminum Electrolytic Capacitor, Radial THT, D13xH20mm, 22uF, 400V; Manufacturer: Wurth Elektronik; Manufacturer Part Number: 860011378007; Capacitance Tolerance: +/-20%; Dissipation Factor: 15%; Endurance: 2000h; Leakage Current: 264uA; Ripple Current: 190mA; Technical Reference: ATAI200220M400DSPACB000; ComponentLink1Description: Manufacturer Link; ComponentLink1URL: https://www.we-online.com/redexpert/article/860011378007?ad; ComponentLink2Description: Datasheet; ComponentLink2URL: https://www.we-online.com/redexpert/spec/860011378007?ad; Category: Aluminum Electrolytic Capacitors; Match Code: WCAP-ATG8; Mount: Through Hole; Operating Temperature Max: 85°C; Operating Temperature Min: -25°C; Packaging: Ammo Pack; Height: 20mm; Diameter: 13mm; Capacitance: 22uF; Rated Voltage (DC): 400V
footprint WCAP-ATG8_D13H20
pins: 1 P, 2 N

## 860011378008
designator C?, comment 33uF  (value not drawn)
WCAP-ATG8 Aluminum Electrolytic Capacitor, Radial THT, D13xH25mm, 33uF, 400V; Manufacturer: Wurth Elektronik; Manufacturer Part Number: 860011378008; Capacitance Tolerance: +/-20%; Dissipation Factor: 15%; Endurance: 2000h; Leakage Current: 396uA; Ripple Current: 230mA; Technical Reference: ATAI250330M400DSPACB000; ComponentLink1Description: Manufacturer Link; ComponentLink1URL: https://www.we-online.com/redexpert/article/860011378008?ad; ComponentLink2Description: Datasheet; ComponentLink2URL: https://www.we-online.com/redexpert/spec/860011378008?ad; Category: Aluminum Electrolytic Capacitors; Match Code: WCAP-ATG8; Mount: Through Hole; Operating Temperature Max: 85°C; Operating Temperature Min: -25°C; Packaging: Ammo Pack; Height: 25mm; Diameter: 13mm; Capacitance: 33uF; Rated Voltage (DC): 400V
footprint WCAP-ATG8_D13H25
pins: 1 P, 2 N

## 860011380009
designator C?, comment 47uF  (value not drawn)
WCAP-ATG8 Aluminum Electrolytic Capacitor, Radial THT, D16xH25mm, 47uF, 400V; Manufacturer: Wurth Elektronik; Manufacturer Part Number: 860011380009; Capacitance Tolerance: +/-20%; Dissipation Factor: 15%; Endurance: 2000h; Leakage Current: 564uA; Ripple Current: 270mA; Technical Reference: ATAK250470M400DSPAEB000; ComponentLink1Description: Manufacturer Link; ComponentLink1URL: https://www.we-online.com/redexpert/article/860011380009?ad; ComponentLink2Description: Datasheet; ComponentLink2URL: https://www.we-online.com/redexpert/spec/860011380009?ad; Category: Aluminum Electrolytic Capacitors; Match Code: WCAP-ATG8; Mount: Through Hole; Operating Temperature Max: 85°C; Operating Temperature Min: -25°C; Packaging: Ammo Pack; Height: 25mm; Diameter: 16mm; Capacitance: 47uF; Rated Voltage (DC): 400V
footprint WCAP-ATG8_D16H25
pins: 1 P, 2 N

## 860011380010
designator C?, comment 68uF  (value not drawn)
WCAP-ATG8 Aluminum Electrolytic Capacitor, Radial THT, D16xH35.5mm, 68uF, 400V; Manufacturer: Wurth Elektronik; Manufacturer Part Number: 860011380010; Capacitance Tolerance: +/-20%; Dissipation Factor: 15%; Endurance: 2000h; Leakage Current: 816uA; Ripple Current: 410mA; Technical Reference: ATAK355680M400DSPADB000; ComponentLink1Description: Manufacturer Link; ComponentLink1URL: https://www.we-online.com/redexpert/article/860011380010?ad; ComponentLink2Description: Datasheet; ComponentLink2URL: https://www.we-online.com/redexpert/spec/860011380010?ad; Category: Aluminum Electrolytic Capacitors; Match Code: WCAP-ATG8; Mount: Through Hole; Operating Temperature Max: 85°C; Operating Temperature Min: -25°C; Packaging: Ammo Pack; Height: 35.5mm; Diameter: 16mm; Capacitance: 68uF; Rated Voltage (DC): 400V
footprint WCAP-ATG8_D16H35.5
pins: 1 P, 2 N

## 860011381011
designator C?, comment 68uF  (value not drawn)
WCAP-ATG8 Aluminum Electrolytic Capacitor, Radial THT, D18xH25mm, 68uF, 400V; Manufacturer: Wurth Elektronik; Manufacturer Part Number: 860011381011; Capacitance Tolerance: +/-20%; Dissipation Factor: 15%; Endurance: 2000h; Leakage Current: 816uA; Ripple Current: 380mA; Technical Reference: ATAL250680M400DSPAEB000; ComponentLink1Description: Manufacturer Link; ComponentLink1URL: https://www.we-online.com/redexpert/article/860011381011?ad; ComponentLink2Description: Datasheet; ComponentLink2URL: https://www.we-online.com/redexpert/spec/860011381011?ad; Category: Aluminum Electrolytic Capacitors; Match Code: WCAP-ATG8; Mount: Through Hole; Operating Temperature Max: 85°C; Operating Temperature Min: -25°C; Packaging: Ammo Pack; Height: 25mm; Diameter: 18mm; Capacitance: 68uF; Rated Voltage (DC): 400V
footprint WCAP-ATG8_D18H25
pins: 1 P, 2 N

## 860011381012
designator C?, comment 100uF  (value not drawn)
WCAP-ATG8 Aluminum Electrolytic Capacitor, Radial THT, D18xH31.5mm, 100uF, 400V; Manufacturer: Wurth Elektronik; Manufacturer Part Number: 860011381012; Capacitance Tolerance: +/-20%; Dissipation Factor: 15%; Endurance: 2000h; Leakage Current: 1200uA; Ripple Current: 440mA; Technical Reference: ATAL315101M400DSPAEB000; ComponentLink1Description: Manufacturer Link; ComponentLink1URL: https://www.we-online.com/redexpert/article/860011381012?ad; ComponentLink2Description: Datasheet; ComponentLink2URL: https://www.we-online.com/redexpert/spec/860011381012?ad; Category: Aluminum Electrolytic Capacitors; Match Code: WCAP-ATG8; Mount: Through Hole; Operating Temperature Max: 85°C; Operating Temperature Min: -25°C; Packaging: Ammo Pack; Height: 31.5mm; Diameter: 18mm; Capacitance: 100uF; Rated Voltage (DC): 400V
footprint WCAP-ATG8_D18H31.5
pins: 1 P, 2 N

## 860011381013
designator C?, comment 120uF  (value not drawn)
WCAP-ATG8 Aluminum Electrolytic Capacitor, Radial THT, D18xH41mm, 120uF, 400V; Manufacturer: Wurth Elektronik; Manufacturer Part Number: 860011381013; Capacitance Tolerance: +/-20%; Dissipation Factor: 15%; Endurance: 2000h; Leakage Current: 1440uA; Ripple Current: 520mA; Technical Reference: ATAL410121M400DSPS1B000; ComponentLink1Description: Manufacturer Link; ComponentLink1URL: https://www.we-online.com/redexpert/article/860011381013?ad; ComponentLink2Description: Datasheet; ComponentLink2URL: https://www.we-online.com/redexpert/spec/860011381013?ad; Category: Aluminum Electrolytic Capacitors; Match Code: WCAP-ATG8; Mount: Through Hole; Operating Temperature Max: 85°C; Operating Temperature Min: -25°C; Packaging: Ammo Pack; Height: 41mm; Diameter: 18mm; Capacitance: 120uF; Rated Voltage (DC): 400V
footprint WCAP-ATG8_D18H41
pins: 1 P, 2 N